# Altium footprint library custom.PcbLib: 330 footprints (part 12 of 21)
Each footprint in its own frame and in the unit in brackets; x right, y up, seen from the top. Pads: shape width x height; smd on the part's side, far side on the other; paste and mask are expansions set on the pad; w line width, h text height; cw(c..) or ccw(c..) is an arc to the next point about the centre after c.
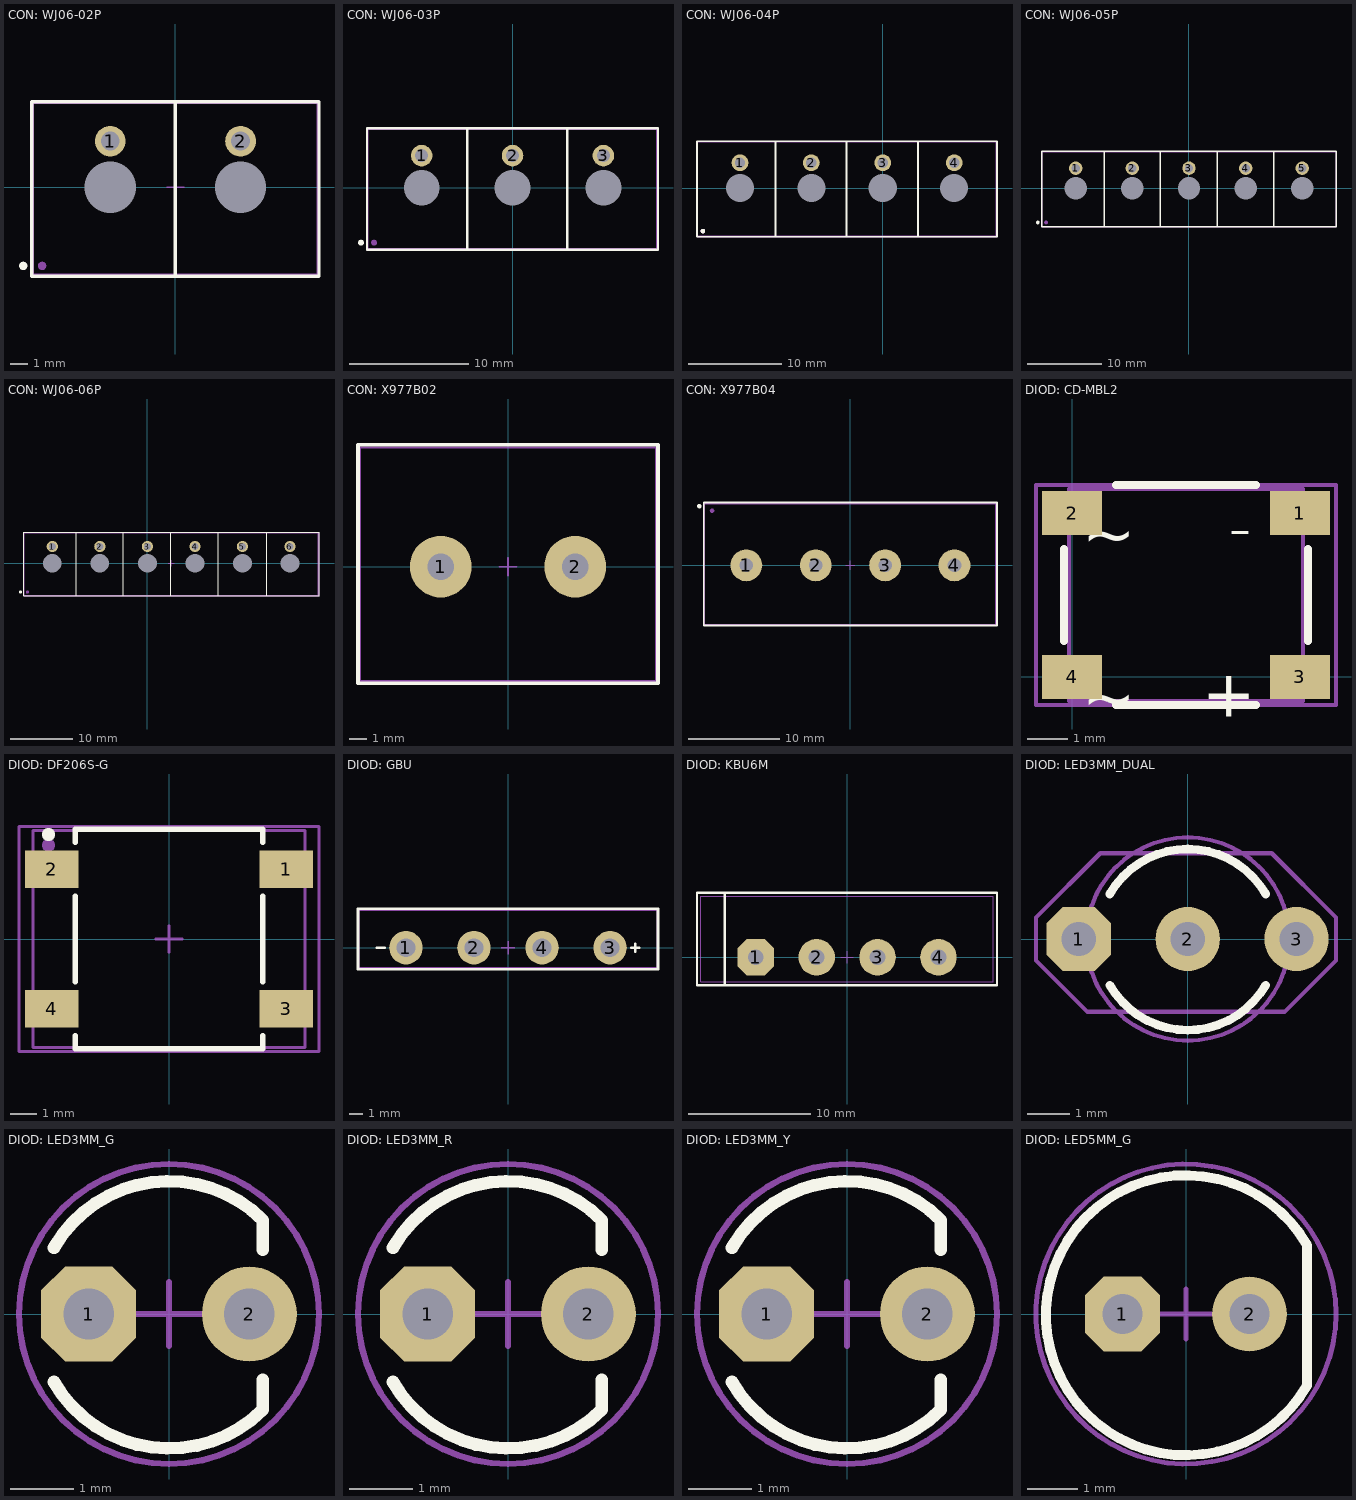
[diagram p11: the footprints below, top view; thin cyan lines are the x and y axes]

## CON: WJ06-02P [mm]
pads (6):
  round 1.8 hole 1.1: 1(-3.81,2.7) 2(3.81,2.7)
  round 0.5 on Top Overlay: ""(-8.9,-4.6)
  round 0.5 on Mech1: ""(-7.8,-4.6)
  round 2.4 hole 3: ""(-3.81,0) ""(3.81,0)
Top Overlay:
  lines w0.2: 0,-5.2 0,5 ; -8.4,-5.2 -8.4,5 8.4,5 8.4,-5.2 -8.4,-5.2
Top Assy:
  lines w0.1: -8.31,-5.08 8.31,-5.08 8.31,4.92 -8.31,4.92 -8.31,-5.08
Size Area:
  lines w0.1: -0.5,0 0.5,0 ; 0,-0.5 0,0.5 ; -8.4,-5.175 8.4,-5.175 8.4,5 -8.4,5 -8.4,-5.175
3D body "разъем.STEP": height 6.01, standoff 0.01, extent -8.31,-5.08 8.31,4.92

## CON: WJ06-03P [mm]
pads (8):
  round 1.8 hole 1.1: 1(-7.62,2.7) 2(0,2.7) 3(7.62,2.7)
  round 0.5 on Top Overlay: ""(-12.71,-4.6)
  round 0.5 on Mech1: ""(-11.61,-4.6)
  round 2.4 hole 3: ""(-7.62,0) ""(0,0) ""(7.62,0)
Top Overlay:
  lines w0.2: -3.81,-5.2 -3.81,5 ; 4.59,-5.2 12.2,-5.2 12.2,5 4.59,5 ; 4.59,-5.2 -12.21,-5.2 -12.21,5 4.59,5 ; 4.59,-5.2 4.59,5
Top Assy:
  lines w0.1: -12.12,-5.08 12.1,-5.08 12.1,4.92 -12.12,4.92 -12.12,-5.08
Size Area:
  lines w0.1: -0.5,0 0.5,0 ; 0,-0.5 0,0.5 ; -12.21,-5.175 4.59,-5.175 4.59,5 -12.21,5 -12.21,-5.175
3D body "Разъем 3х7.62.STEP": height 6, standoff 0, extent -12.12,-5.08 12.12,4.92

## CON: WJ06-04P [mm]
pads (10):
  round 1.8 hole 1.1: 1(-15.24,2.7) 2(-7.62,2.7) 3(0,2.7) 4(7.63,2.7)
  round 0.5 on Mech1: ""(-19.2,-4.6)
  round 0.5 on Top Overlay: ""(-19.2,-4.6)
  round 2.4 hole 3: ""(-15.24,0) ""(-7.62,0) ""(0,0) ""(7.62,0)
Top Overlay:
  lines w0.2: -11.43,-5.2 -11.43,5 ; -3.03,-5.2 -19.83,-5.2 -19.83,5 -3.03,5 ; 3.78,-5.2 3.78,5 ; -3.87,-5.2 12.2,-5.2 12.2,5 -3.87,5 -3.87,-5.2
Top Assy:
  lines w0.1: -19.74,-5.08 12.1,-5.08 12.1,4.92 -19.74,4.92 -19.74,-5.08
Size Area:
  lines w0.1: -8.12,0 -7.12,0 ; -7.62,-0.5 -7.62,0.5 ; -19.83,-5.175 12.2,-5.175 12.2,5 -19.83,5 -19.83,-5.175
3D body "Разъем 4pin.STEP": height 5.95, standoff -0.05, extent -19.74,-5.08 12.12,4.92

## CON: WJ06-05P [mm]
pads (12):
  round 1.8 hole 1.1: 1(-15.24,2.7) 2(-7.62,2.7) 3(0,2.7) 4(7.63,2.7) 5(15.23,2.7)
  round 0.5 on Top Overlay: ""(-20.33,-4.6)
  round 0.5 on Mech1: ""(-19.23,-4.6)
  round 2.4 hole 3: ""(-15.24,0) ""(-7.62,0) ""(0,0) ""(7.62,0) ""(15.24,0)
Top Overlay:
  lines w0.2: -11.43,-5.2 -11.43,5 ; -3.03,-5.2 -19.83,-5.2 -19.83,5 -3.03,5 ; 3.78,-5.2 3.78,5 ; 11.38,-5.2 11.38,5 ; -3.87,-5.2 -3.87,5 19.78,5 19.78,-5.2 -3.87,-5.2
Top Assy:
  lines w0.1: -19.74,-5.08 -19.74,4.92 19.78,4.92 19.78,-5.08 -19.74,-5.08
Size Area:
  lines w0.1: -8.12,0 -7.12,0 ; -7.62,-0.5 -7.62,0.5 ; -19.83,-5.175 -19.83,5 19.78,5 19.78,-5.175 -19.83,-5.175
3D body "Connector 5pin.STEP": height 6.12, standoff 0.04, extent -19.74,-5.08 19.74,4.972

## CON: WJ06-06P [mm]
pads (14):
  round 1.8 hole 1.1: 1(-15.24,2.7) 2(-7.62,2.7) 3(0,2.7) 4(7.63,2.7) 5(15.23,2.7) 6(22.85,2.7)
  round 0.5 on Top Overlay: ""(-20.33,-4.6)
  round 0.5 on Mech1: ""(-19.23,-4.6)
  round 2.4 hole 3: ""(-15.24,0) ""(-7.62,0) ""(0,0) ""(7.62,0) ""(15.24,0) ""(22.86,0)
Top Overlay:
  lines w0.2: -11.43,-5.2 -11.43,5 ; -3.03,-5.2 -19.83,-5.2 -19.83,5 -3.03,5 ; 3.78,-5.2 3.78,5 ; 11.38,-5.2 11.38,5 ; 19.1,-5.2 19.1,5 ; -3.87,-5.2 27.5,-5.2 27.5,5 -3.87,5 -3.87,-5.2
Top Assy:
  lines w0.1: -19.74,-5.08 27.4,-5.08 27.4,4.92 -19.74,4.92 -19.74,-5.08
Size Area:
  lines w0.1: 3.3,0 4.3,0 ; 3.8,-0.5 3.8,0.5 ; -19.83,-5.175 27.5,-5.175 27.5,5 -19.83,5 -19.83,-5.175
3D body "Разъем 6 выводов.STEP": height 6.17, standoff 0.17, extent -19.74,-5.08 27.36,4.92

## CON: X977B02 [mm]
pads (2):
  round 3.5 hole 1.5: 1(-3.81,0) 2(3.81,0)
Top Overlay:
  lines w0.2: -8.5,-6.6 -8.5,6.9 8.5,6.9 8.5,-6.6 -8.5,-6.6
Top Assy:
  lines w0.1: -8.37,-6.484 -8.37,6.75 8.37,6.75 8.37,-6.484 -8.37,-6.484
Size Area:
  lines w0.1: -0.5,0 0.5,0 ; 0,-0.5 0,0.5 ; -8.5,-6.6 8.5,-6.6 8.5,6.9 -8.5,6.9 -8.5,-6.6
3D body "User Library-DG25C-1.STEP": height 14.8, standoff -4.79, extent -8.37,-6.484 8.37,6.75

## CON: X977B04 [mm]
pads (6):
  round 3.5 hole 1.5: 1(-11.43,0) 2(-3.81,0) 3(3.81,0) 4(11.43,0)
  round 0.5 on Top Overlay: ""(-16.6,6.5)
  round 0.5 on Mech1: ""(-15.2,6)
Top Overlay:
  lines w0.2: -16.1,-6.6 -16.1,6.9 16.1,6.9 16.1,-6.6 -16.1,-6.6
Top Assy:
  lines w0.1: -15.99,6.75 -15.99,6.75 ; -15.99,6.75 -15.99,-6.484 15.99,-6.484 15.99,6.75 -15.99,6.75
Size Area:
  lines w0.1: -0.5,0 0.5,0 ; 0,-0.5 0,0.5 ; -16.1,-6.6 16.1,-6.6 16.1,6.85 -16.1,6.85 -16.1,-6.6
3D body "User Library-DG25C-1.STEP": height 14.8, standoff -4.79, extent -0.75,-6.484 15.99,6.75
3D body "User Library-DG25C-1.STEP": height 14.8, standoff -4.79, extent -15.99,-6.484 0.75,6.75

## DIOD: CD-MBL2 [mm]
pads (4):
  rect 1.5x1.1 smd: 1(5.7,4.1) 2(0,4.1) 3(5.7,0) 4(0,0)
Top Overlay:
  lines w0.2: -0.2,0.9 -0.2,3.2 ; 1.1,-0.7 4.6,-0.7 ; 1.1,4.8 4.6,4.8 ; 5.9,0.9 5.9,3.2
  text "-" at 4.5,4.4 h2
  text "+" at 4.6,0.4 h2
  text "~" at 1.6,0.3 h2
  text "~" at 1.6,4.4 h2
Top Assy:
  lines w0.1: -0.07,-0.6 -0.07,4.7 5.77,4.7 5.77,-0.6 -0.07,-0.6
  text "+" at 5.2,0.4 h2
  text "-" at 5.2,4.4 h2
  text "~" at 0.9,4.4 h2
  text "~" at 0.9,0.3 h2
Size Area:
  lines w0.1: -0.9,-0.7 6.6,-0.7 6.6,4.8 -0.9,4.8 -0.9,-0.7
3D body "CD-MBL206SL.STEP": height 1.22, standoff 0, extent -0.07,-0.6 5.77,4.7

## DIOD: DF206S-G [mm]
height 22
pads (6):
  rect 2x1.4 smd: 1(4.37,2.605) 2(-4.37,2.605) 3(4.37,-2.605) 4(-4.37,-2.605)
  round 0.5 on Mech1: ""(-4.5,3.5)
  round 0.5 on Top Overlay: ""(-4.5,3.9)
Top Overlay:
  lines w0.2: -3.5,-3.6 -3.5,-4.1 3.5,-4.1 3.5,-3.6 ; -3.5,-1.6 -3.5,1.6 ; -3.5,3.6 -3.5,4.1 3.5,4.1 3.5,3.6 ; 3.5,-1.6 3.5,1.6
Top Assy:
  lines w0.1: -5.075,-4.05 5.075,-4.05 5.075,4.05 -5.075,4.05 -5.075,-4.05
Size Area:
  lines w0.1: -0.5,0 0.5,0 ; 0,-0.5 0,0.5 ; -5.6,-4.2 5.6,-4.2 5.6,4.2 -5.6,4.2 -5.6,-4.2
3D body "User Library-PONTE-1.STEP": height 2.7, standoff 0, extent -5.075,-4.05 5.075,4.05

## DIOD: GBU [mm] "SMD Diode Bridge"
height 2
pads (4):
  round 2.5 hole 1.4: 1(-7.62,0) 2(-2.54,0) 3(7.62,0) 4(2.54,0)
Top Overlay:
  lines w0.2: -9.8,0 -9.2,0 ; 9.2,0 9.8,0 ; 9.5,-0.3 9.5,0.3 ; -11.2,-1.6 11.2,-1.6 11.2,2.9 -11.2,2.9 -11.2,-1.6
Top Assy:
  lines w0.1: -9.8,0 -9.2,0 ; 9.2,0 9.8,0 ; 9.5,-0.3 9.5,0.3 ; -11.15,-1.5 11.15,-1.5 11.15,-0.8 11.15,2.81 -11.15,2.81 -11.15,-1.5
Size Area:
  lines w0.1: -0.5,0 0.5,0 ; 0,-0.5 0,0.5 ; -11.2,-1.6 11.2,-1.6 11.2,2.9 -11.2,2.9 -11.2,-1.6
3D body "User Library-GBU10A.STEP": height 23.8, standoff -13.1, extent -11.15,-0.8 11.15,2.81

## DIOD: KBU6M [mm]
height 22
pads (4):
  oct 3x3 hole 1.3: 1(-7.5,0)
  round 3 hole 1.3: 2(-2.5,0) 3(2.5,0) 4(7.5,0)
Top Overlay:
  lines w0.2: -10.04,-2.31 -10.04,5.31 ; -12.326,-2.31 12.312,-2.31 12.312,5.31 -12.326,5.31 -12.326,-2.31
Top Assy:
  lines w0.1: -10,-2 -10,5 ; -12,-2 12,-2 12,5 -12,5 -12,-2
Size Area:
  lines w0.1: -0.5,0 0.5,0 ; 0,-0.5 0,0.5 ; -12.326,-2.31 -12.326,5.31 12.312,5.31 12.312,-2.31 -12.326,-2.31
3D body "KBU6M.STEP": height 19.8, standoff -2, extent -11.85,-2.1 11.85,5

## DIOD: LED3MM_DUAL [mm] "Leaded Dual Color 3mm Led"
height 10
pads (3):
  oct 1.5x1.5 hole 0.8: 1(-2.54,0)
  round 1.5 hole 0.8: 2(0,0) 3(2.54,0)
Top Overlay:
  lines w0.2: -1.819,-1.075 ccw(c0,-0.025) 1.819,-1.075 ; -1.819,1.05 cw(c0,0) 1.819,1.05
Top Assy:
  circle w0.1: c0,0 r2.372
Size Area:
  lines w0.1: -3.54,-0.5 -3.54,0.5 -2.04,2 1.96,2 3.46,0.5 3.46,-0.5 2.26,-1.7 -2.34,-1.7 -3.54,-0.5 ; -0.5,0 0.5,0 -0.5,0 ; 0,-0.5 0,0.5 0,-0.5
3D body "3mm_led_dual.STEP": height 11.5, standoff -1, extent -2.846,-1.585 2.838,1.915

## DIOD: LED3MM_G [mm] "Green Leaded Led, 3 mm"
height 12
pads (2):
  oct 1.5x1.5 hole 0.8: 1(-1.27,0)
  round 1.5 hole 0.8: 2(1.27,0)
Top Overlay:
  lines w0.2: -1.819,-1.075 ccw(c0,-0.025) 1.485,-1.51 1.485,-1.04 ; -1.819,1.05 cw(c0,0) 1.485,1.485 1.485,1.015
Top Assy:
  circle w0.1: c0,0 r2.372
Size Area:
  circle w0.1: c0,0 r2.372
  lines w0.1: -0.5,0 0.5,0 ; 0,-0.5 0,0.5
3D body "3mm_led_grn.STEP": height 12, standoff -1, extent -2,-2 2,2

## DIOD: LED3MM_R [mm] "Red Leaded Led, 3 mm"
height 12
pads (2):
  oct 1.5x1.5 hole 0.8: 1(-1.27,0)
  round 1.5 hole 0.8: 2(1.27,0)
Top Overlay:
  lines w0.2: -1.819,-1.075 ccw(c0,-0.025) 1.485,-1.51 1.485,-1.04 ; -1.819,1.05 cw(c0,0) 1.485,1.485 1.485,1.015
Top Assy:
  circle w0.1: c0,0 r2.372
Size Area:
  circle w0.1: c0,0 r2.372
  lines w0.1: -0.5,0 0.5,0 ; 0,-0.5 0,0.5
3D body "3mm_led_red.STEP": height 12, standoff -1, extent -2,-2 2,2

## DIOD: LED3MM_Y [mm] "Yellow Leaded Led, 3 mm"
height 12
pads (2):
  oct 1.5x1.5 hole 0.8: 1(-1.27,0)
  round 1.5 hole 0.8: 2(1.27,0)
Top Overlay:
  lines w0.2: 1.485,-1.51 cw(c0,-0.025) -1.819,-1.075 ccw(c0,-0.025) 1.485,-1.51 ; 1.485,-1.51 1.485,-1.04 1.485,-1.51 ; 1.485,1.485 ccw(c0,0) -1.819,1.05 cw(c0,0) 1.485,1.485 ; 1.485,1.485 1.485,1.015 1.485,1.485
Top Assy:
  circle w0.1: c0,0 r2.372
Size Area:
  circle w0.1: c0,0 r2.372
  lines w0.1: -0.5,0 0.5,0 ; 0,-0.5 0,0.5
3D body "3mm_led_yell.STEP": height 12, standoff -1, extent -2,-2 2,2

## DIOD: LED5MM_G [mm] "Green Leaded Led, 5 mm"
height 12
pads (2):
  oct 1.5x1.5 hole 0.8: 1(-1.27,0)
  round 1.5 hole 0.8: 2(1.27,0)
Top Overlay:
  lines w0.2: 2.425,-1.425 cw(c0,-0.025) 2.425,1.375 2.425,-1.425
Top Assy:
  circle w0.1: c0,0 r3
Size Area:
  circle w0.1: c0,0 r3
  lines w0.1: -0.5,0 0.5,0 ; 0,-0.5 0,0.5
3D body "5mm_led_grn.STEP": height 14.5, standoff -1, extent -3,-3 3,3